# Altium footprint library PCB_GENERAL.PcbLib: 226 footprints (part 12 of 15)
Each footprint in its own frame and in the unit in brackets; x right, y up, seen from the top. Pads: shape width x height; smd on the part's side, far side on the other; paste and mask are expansions set on the pad; w line width, h text height; cw(c..) or ccw(c..) is an arc to the next point about the centre after c.
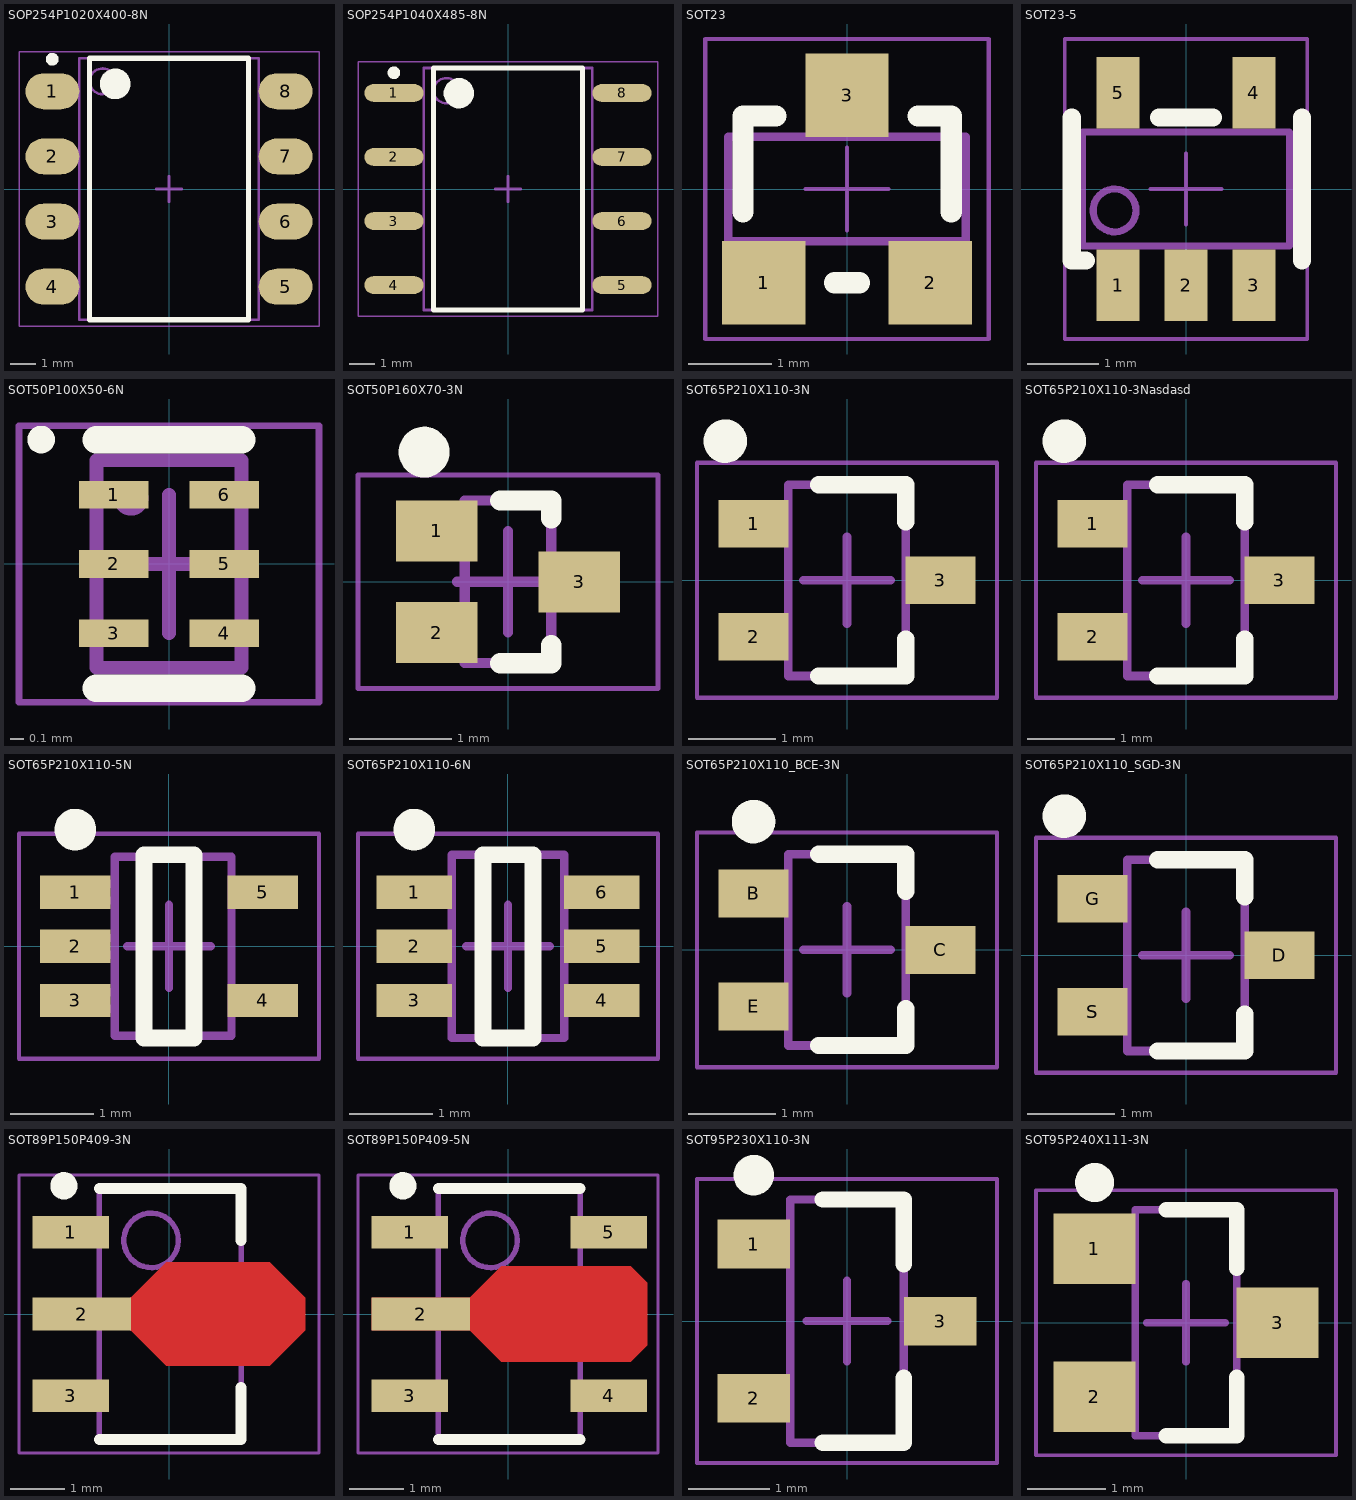
[diagram p11: the footprints below, top view; thin cyan lines are the x and y axes]

## SOP254P1020X400-8N [mm] "SOP, 8-Leads, Body 9,68x6,50mm, Pitch 2,54mm, IPC Medium Density"
height 4
pads (8):
  oval 2.1x1.4 smd: 1(-4.55,3.81) 2(-4.55,1.27) 3(-4.55,-1.27) 4(-4.55,-3.81) 5(4.55,-3.81) 6(4.55,-1.27) 7(4.55,1.27) 8(4.55,3.81)
Top Overlay:
  circle w0.25: c-4.55,5.06 r0.125
  circle w0.6: c-2.1,4.1 r0.3
  lines w0.2: -3.1,-5.1 -3.1,5.1 3.1,5.1 3.1,-5.1 -3.1,-5.1
Mechanical 11:
  text ".Designator" at -2.8,-0.3 h1.52
Mechanical 14:
  circle w0.1: c-2.6,4.2 r0.5
  lines w0.1: -3.5,-5.1 -3.5,5.1 3.5,5.1 3.5,-5.1 -3.5,-5.1
Mechanical 15:
  lines w0.05: -5.85,-5.35 -5.85,5.35 5.85,5.35 5.85,-5.35 -5.85,-5.35
  lines w0.1: -0.5,0 0.5,0 ; 0,-0.5 0,0.5
3D body "SW3dPS-pdip8-smd.STEP": height 5.09, standoff 0.01, extent -5.15,-4.955 5.15,4.955

## SOP254P1040X485-8N [mm] "TSOP, 8-Leads, Body 9,50x6,62mm, Pitch 2,54mm, IPC Medium Density"
height 1.2
pads (8):
  oval 2.35x0.7 smd: 1(-4.525,3.81) 2(-4.525,1.27) 3(-4.525,-1.27) 4(-4.525,-3.81) 5(4.525,-3.81) 6(4.525,-1.27) 7(4.525,1.27) 8(4.525,3.81)
Top Overlay:
  circle w0.6: c-1.95,3.8 r0.3
  circle w0.25: c-4.525,4.61 r0.125
  lines w0.2: -2.95,-4.8 2.95,-4.8 2.95,4.8 -2.95,4.8 -2.95,-4.8
Mechanical 11:
  text ".Designator" at -3.2,-0.575 h1.52
Mechanical 13:
  circle w0.1: c-2.45,3.9 r0.5
  lines w0.1: -3.35,-4.8 3.35,-4.8 3.35,4.8 -3.35,4.8 -3.35,-4.8
Mechanical 15:
  lines w0.05: -5.95,-5.05 5.95,-5.05 5.95,5.05 -5.95,5.05 -5.95,-5.05
  lines w0.1: -0.5,0 0.5,0 ; 0,-0.5 0,0.5
3D body: height 1.2, standoff 0.1, extent -3.35,-4.8 3.35,4.8

## SOT23 [mm]
pads (3):
  rect 1x1 smd: 1(-1,-1.125) 2(1,-1.125) 3(0,1.125)
Top Overlay:
  lines w0.254: -1.25,-0.275 -1.25,0.875 -0.85,0.875 ; -0.15,-1.125 0.15,-1.125 ; 0.85,0.875 1.25,0.875 1.25,-0.275
Mechanical 11:
  text ".Designator" at -2.06,2.14 h0.76
Mechanical 14:
  lines w0.1: -1.2,-0.625 -1.2,-1.2 -0.7,-1.2 -0.7,-0.625 ; -0.25,0.625 -0.25,1.2 0.25,1.2 0.25,0.625 ; 0.7,-0.625 0.7,-1.2 1.2,-1.2 1.2,-0.625 ; -1.425,-0.625 -1.425,0.625 1.425,0.625 1.425,-0.625 -1.425,-0.625
Mechanical 15:
  lines w0.05: -0.5,0 0.5,0 ; 0,-0.5 0,0.5 ; -1.7,-1.8 -1.7,1.8 1.7,1.8 1.7,-1.8 -1.7,-1.8
3D body "SW3dPS-SOT-23.step": height 0.98, standoff -0.01, extent -1.448,-1.21 1.448,1.21

## SOT23-5 [mm]
pads (5):
  rect 0.6x1 smd: 1(-0.95,-1.35) 2(0,-1.35) 3(0.95,-1.35) 4(0.95,1.35) 5(-0.95,1.35)
Top Overlay:
  lines w0.254: -1.6,1 -1.6,-1 -1.4,-1 ; -0.375,1 0.375,1 ; 1.625,-1 1.625,1
Mechanical 11:
  text ".Designator" at -0.9,0 h1
Mechanical 14:
  circle w0.1: c-1,-0.3 r0.3
  lines w0.1: -1.45,-0.8 -1.45,0.8 1.45,0.8 1.45,-0.8 -1.45,-0.8
Mechanical 15:
  lines w0.05: -0.5,0 0.5,0 ; 0,-0.5 0,0.5 ; -1.7,-2.1 -1.7,2.1 1.7,2.1 1.7,-2.1 -1.7,-2.1
3D body "SOT 23-5 MO-178C.step": height 1.45, standoff 0, extent -1.45,-1.405 1.45,1.405

## SOT50P100X50-6N [mm] "SON, 6-Leads, Body 1.45x1.00mm, Pitch 0.50mm, IPC Medium Density"
height 0.5
pads (6):
  rect 0.5x0.2 smd: 1(-0.4,0.5) 2(-0.4,0) 3(-0.4,-0.5) 4(0.4,-0.5) 5(0.4,0) 6(0.4,0.5)
Top Overlay:
  circle w0.1: c-0.925,0.9 r0.05
  lines w0.2: -0.525,-0.9 0.525,-0.9 ; -0.525,0.9 0.525,0.9
Mechanical 11:
  text ".Designator" at -1.05,1.325 h1
Mechanical 14:
  circle w0.2: c-0.275,0.475 r0.025
  lines w0.1: -0.525,-0.75 0.525,-0.75 0.525,0.75 -0.525,0.75 -0.525,-0.75
Mechanical 15:
  lines w0.05: -1.085,-1 -1.085,1 1.085,1 1.085,-1 -1.085,-1
  lines w0.1: -0.5,0 0.5,0 ; 0,-0.5 0,0.5
3D body: height 0.5, standoff 0.04, extent -0.525,-0.75 0.525,0.75

## SOT50P160X70-3N [mm] "SOT23, 3-Leads, Body 1,60x1,60mm, Pitch 0,50mm, IPC Medium Density"
height 0.7
pads (3):
  rect 0.8x0.6 smd: 1(-0.7,0.5) 2(-0.7,-0.5) 3(0.7,0)
Top Overlay:
  circle w0.25: c-0.825,1.275 r0.125
  lines w0.2: -0.075,-0.8 0.425,-0.8 0.425,-0.625 ; -0.075,0.8 0.425,0.8 0.425,0.625
Mechanical 11:
  text ".Designator" at -1.35,-0.15 h0.3
Mechanical 14:
  lines w0.1: -0.425,-0.6 -0.7,-0.6 -0.7,-0.4 -0.425,-0.4 ; -0.425,0.4 -0.7,0.4 -0.7,0.6 -0.425,0.6 ; 0.425,-0.1 0.7,-0.1 0.7,0.1 0.425,0.1 ; -0.425,-0.8 -0.425,0.8 0.425,0.8 0.425,-0.8 -0.425,-0.8
Mechanical 15:
  lines w0.05: -1.475,-1.05 -1.475,1.05 1.475,1.05 1.475,-1.05 -1.475,-1.05
  lines w0.1: -0.5,0 0.5,0 ; 0,-0.5 0,0.5
3D body "User Library-FDY102PZ.STEP": height 0.78, standoff 0, extent -0.85,-0.85 0.85,0.85

## SOT65P210X110-3N [mm] "SOT23, 3-Leads, Body 2,00x2,10mm, Pitch 0,65mm, IPC Medium Density"
height 1.1
pads (3):
  rect 0.8x0.55 smd: 1(-1.075,0.65) 2(-1.075,-0.65) 3(1.075,0)
Top Overlay:
  circle w0.25: c-1.4,1.6 r0.125
  lines w0.2: -0.325,-1.1 0.675,-1.1 0.675,-0.675 ; -0.325,1.1 0.675,1.1 0.675,0.675
Mechanical 11:
  text ".Designator" at -1.625,2.025 h1
Mechanical 14:
  lines w0.1: -0.675,-1.1 -0.675,1.1 0.675,1.1 0.675,-1.1 -0.675,-1.1
Mechanical 15:
  lines w0.05: -1.725,-1.35 -1.725,1.35 1.725,1.35 1.725,-1.35 -1.725,-1.35
  lines w0.1: -0.5,0 0.5,0 ; 0,-0.5 0,0.5
3D body "User Library-sc70-3.step": height 1, standoff 0, extent -1.1,-1.05 1.2,1.05

## SOT65P210X110-3Nasdasd [mm] "SOT23, 3-Leads, Body 2,00x2,10mm, Pitch 0,65mm, IPC Medium Density"
height 1.1
pads (3):
  rect 0.8x0.55 smd: 1(-1.075,0.65) 2(-1.075,-0.65) 3(1.075,0)
Top Overlay:
  circle w0.25: c-1.4,1.6 r0.125
  lines w0.2: -0.325,-1.1 0.675,-1.1 0.675,-0.675 ; -0.325,1.1 0.675,1.1 0.675,0.675
Mechanical 11:
  text ".Designator" at -0.8,1.6 h1
Mechanical 14:
  lines w0.1: -0.675,-1.1 -0.675,1.1 0.675,1.1 0.675,-1.1 -0.675,-1.1
Mechanical 15:
  lines w0.05: -1.725,-1.35 -1.725,1.35 1.725,1.35 1.725,-1.35 -1.725,-1.35
  lines w0.1: -0.5,0 0.5,0 ; 0,-0.5 0,0.5
3D body "SOT65P210X110-3Nasdasd.step": height 1.1, standoff 0, extent -1.2,-1.1 1.2,1.1

## SOT65P210X110-5N [mm] "SOT23, 5-Leads, Body 2,00x2,10mm, Pitch 0,65mm, IPC Medium Density"
height 1.1
pads (5):
  rect 0.85x0.4 smd: 1(-1.125,0.65) 2(-1.125,0) 3(-1.125,-0.65) 4(1.125,-0.65) 5(1.125,0.65)
Top Overlay:
  circle w0.25: c-1.125,1.4 r0.125
  lines w0.2: -0.3,-1.1 0.3,-1.1 0.3,1.1 -0.3,1.1 -0.3,-1.1
Mechanical 11:
  text ".Designator" at -1.975,2.1 h1
Mechanical 14:
  lines w0.1: -0.65,-0.75 -0.925,-0.75 -0.925,-0.55 -0.65,-0.55 ; -0.65,-0.1 -0.925,-0.1 -0.925,0.1 -0.65,0.1 ; -0.65,0.55 -0.925,0.55 -0.925,0.75 -0.65,0.75 ; 0.75,-0.75 1.025,-0.75 1.025,-0.55 0.75,-0.55 ; 0.75,0.55 1.025,0.55 1.025,0.75 0.75,0.75 ; -0.65,-1.075 -0.65,1.075 0.75,1.075 0.75,-1.075 -0.65,-1.075
Mechanical 15:
  lines w0.05: -1.8,-1.35 -1.8,1.35 1.8,1.35 1.8,-1.35 -1.8,-1.35
  lines w0.1: -0.5,0 0.5,0 ; 0,-0.5 0,0.5
3D body "User Library-SC70-5-1.step": height 0.95, standoff 0, extent -1.05,-1 1.05,1

## SOT65P210X110-6N [mm] "SOT23, 6-Leads, Body 2,00x2,10mm, Pitch 0,65mm, IPC Medium Density"
height 1.1
pads (6):
  rect 0.9x0.4 smd: 1(-1.125,0.65) 2(-1.125,0) 3(-1.125,-0.65) 4(1.125,-0.65) 5(1.125,0) 6(1.125,0.65)
Top Overlay:
  circle w0.25: c-1.125,1.4 r0.125
  lines w0.2: -0.3,-1.1 0.3,-1.1 0.3,1.1 -0.3,1.1 -0.3,-1.1
Mechanical 11:
  text ".Designator" at -1.325,-0.25 h1
Mechanical 14:
  lines w0.1: -0.675,-1.1 -0.675,1.1 0.675,1.1 0.675,-1.1 -0.675,-1.1
Mechanical 15:
  lines w0.05: -1.8,-1.35 -1.8,1.35 1.8,1.35 1.8,-1.35 -1.8,-1.35
  lines w0.1: -0.5,0 0.5,0 ; 0,-0.5 0,0.5
3D body "SOT65P210X110-6N.step": height 1.1, standoff 0, extent -1.3,-1.1 1.3,1.1

## SOT65P210X110_BCE-3N [mm] "SOT23, 3-Leads, Body 2,00x2,10mm, Pitch 0,65mm, IPC Medium Density"
height 1.1
pads (3):
  rect 0.8x0.55 smd: B(-1.075,0.65) C(1.075,0) E(-1.075,-0.65)
Top Overlay:
  circle w0.25: c-1.075,1.475 r0.125
  lines w0.2: -0.325,-1.1 0.675,-1.1 0.675,-0.675 ; -0.325,1.1 0.675,1.1 0.675,0.675
Mechanical 11:
  text ".Designator" at -0.775,0.9 h1
Mechanical 14:
  lines w0.1: -0.675,-0.8 -1.05,-0.8 -1.05,-0.5 -0.675,-0.5 ; -0.675,0.5 -1.05,0.5 -1.05,0.8 -0.675,0.8 ; 0.675,-0.15 1.05,-0.15 1.05,0.15 0.675,0.15 ; -0.675,-1.1 0.675,-1.1 0.675,1.1 -0.675,1.1 -0.675,-1.1
Mechanical 15:
  lines w0.05: -1.725,-1.35 1.725,-1.35 1.725,1.35 -1.725,1.35 -1.725,-1.35
  lines w0.1: -0.5,0 0.5,0 ; 0,-0.5 0,0.5
3D body "User Library-sc70-3.step": height 1, standoff 0, extent -1.1,-1.05 1.2,1.05

## SOT65P210X110_SGD-3N [mm] "SOT23, 3-Leads, Body 2,00x2,10mm, Pitch 0,65mm, IPC Medium Density"
height 1.1
pads (3):
  rect 0.8x0.55 smd: D(1.075,0) G(-1.075,0.65) S(-1.075,-0.65)
Top Overlay:
  circle w0.25: c-1.4,1.6 r0.125
  lines w0.2: -0.325,-1.1 0.675,-1.1 0.675,-0.675 ; -0.325,1.1 0.675,1.1 0.675,0.675
Mechanical 11:
  text ".Designator" at -1.625,2.025 h1
Mechanical 14:
  lines w0.1: -0.675,-0.8 -1.05,-0.8 -1.05,-0.5 -0.675,-0.5 ; -0.675,0.5 -1.05,0.5 -1.05,0.8 -0.675,0.8 ; 0.675,-0.15 1.05,-0.15 1.05,0.15 0.675,0.15 ; -0.675,-1.1 0.675,-1.1 0.675,1.1 -0.675,1.1 -0.675,-1.1
Mechanical 15:
  lines w0.05: -1.725,-1.35 1.725,-1.35 1.725,1.35 -1.725,1.35 -1.725,-1.35
  lines w0.1: -0.5,0 0.5,0 ; 0,-0.5 0,0.5
3D body "User Library-sc70-3.step": height 1, standoff 0, extent -1.1,-1.05 1.2,1.05

## SOT89P150P409-3N [mm] "SOT89, 3-Leads, Body 4,50x2,45mm, Pitch 1,50mm, Lead Span 4,1mm, IPC Medium Density"
height 1.6
pads (3):
  rect 1.4x0.6 smd: 1(-1.8,1.5) 3(-1.8,-1.5)
  rect 1.8x0.6 smd: 2(-1.6,0)
Top Layer:
  region: -0.7,0.3 -0.05,0.95 1.85,0.95 2.5,0.3 2.5,-0.3 1.85,-0.95 -0.05,-0.95 -0.7,-0.3
Top Overlay:
  circle w0.25: c-1.927,2.35 r0.125
  lines w0.2: -1.278,-2.3 1.322,-2.3 1.322,-1.35 ; -1.278,2.3 1.322,2.3 1.322,1.35
Mechanical 11:
  text ".Designator" at -2.55,2.825 h0.3
Mechanical 14:
  circle w0.1: c-0.327,1.35 r0.5
  lines w0.1: -1.278,-2.3 -1.278,2.3 1.322,2.3 1.322,-2.3 -1.278,-2.3
Mechanical 15:
  lines w0.05: -2.75,-2.55 -2.75,2.55 2.75,2.55 2.75,-2.55 -2.75,-2.55
  lines w0.1: -0.477,0 0.523,0 ; 0.022,-0.5 0.022,0.5
3D body: height 1.6, standoff 0, extent -1.278,-2.3 1.322,2.3

## SOT89P150P409-5N [mm] "SOT89, 3-Leads, Body 4,50x2,45mm, Pitch 1,50mm, Lead Span 4,1mm, IPC Medium Density"
height 1.6
pads (5):
  rect 1.4x0.6 smd: 1(-1.8,1.5) 3(-1.8,-1.5) 4(1.85,-1.5) 5(1.85,1.5)
  rect 1.8x0.6 smd: 2(-1.6,0)
Top Layer:
  region: -2.5,0.3 -0.7,0.3 -0.125,0.875 2.25,0.875 2.55,0.575 2.55,-0.575 2.25,-0.875 -0.125,-0.875 -0.7,-0.3 -2.5,-0.3
Top Overlay:
  circle w0.25: c-1.927,2.35 r0.125
  lines w0.2: -1.278,-2.3 1.322,-2.3 ; -1.278,2.3 1.322,2.3
Mechanical 11:
  text ".Designator" at -2.55,2.825 h0.3
Mechanical 14:
  circle w0.1: c-0.327,1.35 r0.5
  lines w0.1: -1.278,-2.3 1.322,-2.3 1.322,2.3 -1.278,2.3 -1.278,-2.3
Mechanical 15:
  lines w0.05: -2.75,-2.55 2.75,-2.55 2.75,2.55 -2.75,2.55 -2.75,-2.55
  lines w0.1: -0.477,0 0.523,0 ; 0.022,-0.5 0.022,0.5
3D body: height 1.6, standoff 0, extent -1.278,-2.3 1.322,2.3

## SOT95P230X110-3N [mm] "SOT23, 3-Leads, Body 2,90x2,30mm, Pitch 0,95mm, IPC Medium Density"
height 1.1
pads (3):
  rect 0.9x0.6 smd: 1(-1.15,0.95) 2(-1.15,-0.95) 3(1.15,0)
Top Overlay:
  circle w0.25: c-1.15,1.8 r0.125
  lines w0.2: -0.3,-1.5 0.7,-1.5 0.7,-0.7 ; -0.3,1.5 0.7,1.5 0.7,0.7
Mechanical 11:
  text ".Designator" at -1.025,-0.05 h0.3
Mechanical 14:
  lines w0.1: -0.7,-1.5 -0.7,1.5 0.7,1.5 0.7,-1.5 -0.7,-1.5
Mechanical 15:
  lines w0.05: -1.85,-1.75 -1.85,1.75 1.85,1.75 1.85,-1.75 -1.85,-1.75
  lines w0.1: -0.5,0 0.5,0 ; 0,-0.5 0,0.5
3D body "SOT95P230X110-3N.step": height 1.1, standoff 0, extent -1.3,-1.5 1.3,1.5

## SOT95P240X111-3N [mm] "SOT23, 3-Leads, Body 2,90x2,37mm, Pitch 0,95mm, IPC Medium Density"
height 1.11
pads (3):
  rect 1.05x0.9 smd: 1(-1.175,0.95) 2(-1.175,-0.95) 3(1.175,0)
Top Overlay:
  circle w0.25: c-1.175,1.8 r0.125
  lines w0.2: -0.25,-1.45 0.65,-1.45 0.65,-0.7 ; -0.25,1.45 0.65,1.45 0.65,0.7
Mechanical 11:
  text ".Designator" at -1.35,-0.175 h0.3
Mechanical 14:
  lines w0.1: -0.65,-1.15 -1.1,-1.15 -1.1,-0.75 -0.65,-0.75 ; -0.65,0.75 -1.1,0.75 -1.1,1.15 -0.65,1.15 ; 0.65,-0.2 1.1,-0.2 1.1,0.2 0.65,0.2 ; -0.65,-1.45 -0.65,1.45 0.65,1.45 0.65,-1.45 -0.65,-1.45
Mechanical 15:
  lines w0.05: -1.925,-1.7 1.925,-1.7 1.925,1.7 -1.925,1.7 -1.925,-1.7
  lines w0.1: -0.5,0 0.5,0 ; 0,-0.5 0,0.5
3D body "SW3dPS-SOT-23.step": height 0.98, standoff -0.01, extent -1.21,-1.448 1.21,1.448